# Altium footprint library Components.PcbLib: 63 footprints (part 1 of 4)
Each footprint in its own frame and in the unit in brackets; x right, y up, seen from the top. Pads: shape width x height; smd on the part's side, far side on the other; paste and mask are expansions set on the pad; w line width, h text height; cw(c..) or ccw(c..) is an arc to the next point about the centre after c.
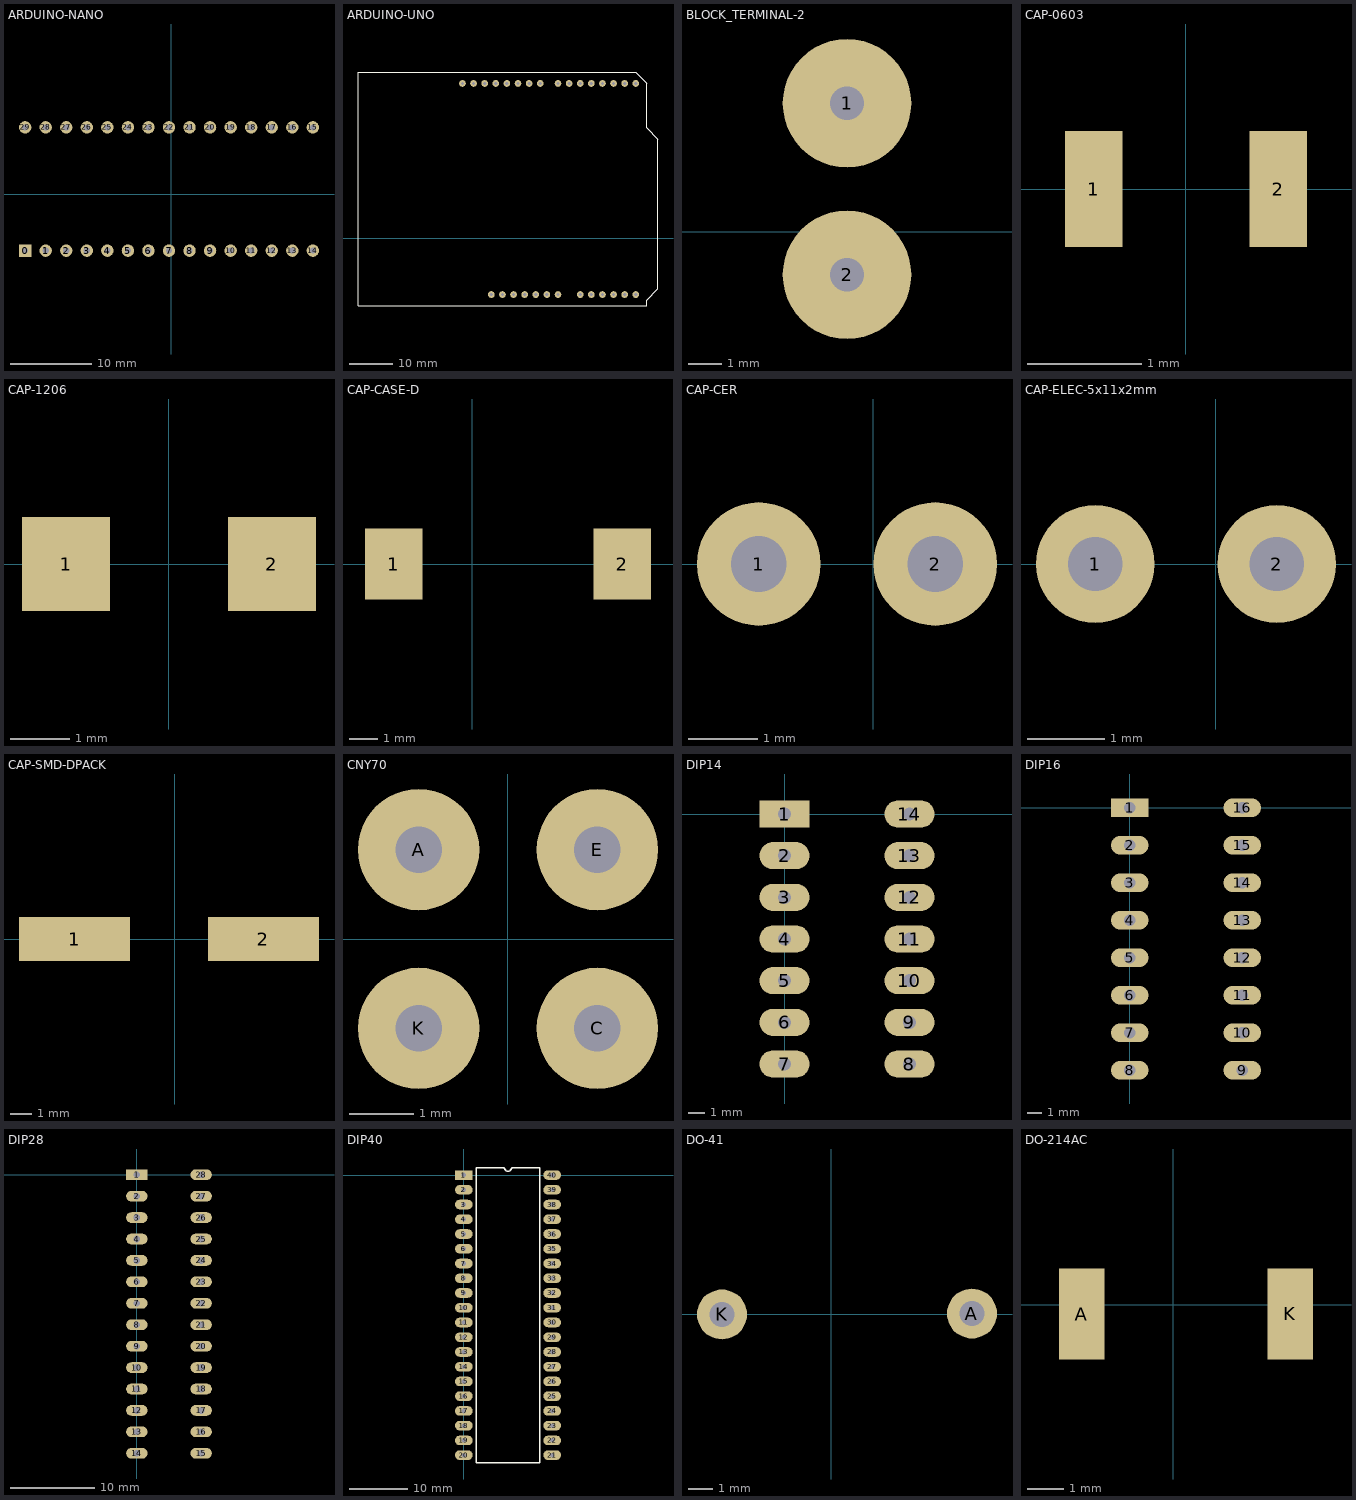
[diagram p0: the footprints below, top view; thin cyan lines are the x and y axes]

## ARDUINO-NANO [mil]
pads (30):
  rect 60x60 hole 30: 0(-711.22,-275.08)
  round 60 hole 30: 1(-611.22,-275.08) 2(-511.22,-275.08) 3(-411.22,-275.08) 4(-311.22,-275.08) 5(-211.22,-275.08) 6(-111.22,-275.08) 7(-11.22,-275.08) 8(88.78,-275.08) 9(188.78,-275.08) 10(288.78,-275.08) 11(388.78,-275.08) 12(488.78,-275.08) 13(588.78,-275.08) 14(688.78,-275.08) 15(688.78,324.92) 16(588.78,324.92) 17(488.78,324.92) 18(388.78,324.92) 19(288.78,324.92) 20(188.78,324.92) 21(88.78,324.92) 22(-11.22,324.92) 23(-111.22,324.92) 24(-211.22,324.92) 25(-311.22,324.92) 26(-411.22,324.92) 27(-511.22,324.92) 28(-611.22,324.92) 29(-711.22,324.92)

## ARDUINO-UNO [mil]
pads (29):
  round 60 hole 30: 0(3562.2,1394.49) 1(3462.2,1394.49) 2(3362.2,1394.49) 3(3262.2,1394.49) 3.3V(2462.2,-505.51) 4(3162.2,1394.49) 5(3062.2,1394.49) 5V(2562.2,-505.51) 6(2962.2,1394.49) 7(2862.2,1394.49) 8(2702.2,1394.49) 9(2602.2,1394.49) 10(2502.2,1394.49) 11(2402.2,1394.49) 12(2302.2,1394.49) 13(2202.2,1394.49) A0(3062.2,-505.51) A1(3162.2,-505.51) A2(3262.2,-505.51) A3(3362.2,-505.51) A4(3462.2,-505.51) A5(3562.2,-505.51) AREF(2002.2,1394.49) GND(2102.2,1394.49) GND(2662.2,-505.51) GND(2762.2,-505.51) IOREF(2262.2,-505.51) RESET(2362.2,-505.51) VIN(2862.2,-505.51)
Top Overlay:
  lines w5: 1062.2,-605.51 3662.2,-605.51 3662.2,-555.51 3762.2,-455.51 3762.2,894.49 3662.2,994.49 3662.2,1394.49 3562.2,1494.49 1062.2,1494.49 1062.2,-605.51

## BLOCK_TERMINAL-2 [mil]
pads (2):
  round 150 hole 39.37: 1(445,150) 2(445,-50)
3D body "User Library-TB2.STEP": height 400, standoff -131.5, extent 265.04,-146.85 580,246.85

## CAP-0603 [mil]
pads (2):
  rect 20x40 smd: 1(-31.89,0) 2(31.89,0)
3D body "User Library-0603 SMD Capacitor.step": height 11.89, standoff 0, extent -31.49,-15.74 31.5,15.75

## CAP-1206 [mm]
pads (2):
  rect 1.5x1.6 smd: 1(-1.75,0) 2(1.75,0)
3D body "User Library-1206 SMD Capacitor.step": height 1.26, standoff 0.25, extent -1.6,-0.762 1.6,0.838

## CAP-CASE-D [mil]
pads (2):
  rect 80x100 smd: 1(-110,0) 2(210,0)
3D body "User Library-Tantalum Cap Case D.step": height 110.24, standoff 0, extent -90.55,-84.64 190.56,84.65

## CAP-CER [mil]
pads (2):
  round 70 hole 31.5: 1(-65,0) 2(35,0)
3D body "User Library-Ceramic Capacitor 5x3_75mm.step": height 206.79, standoff -145.91, extent -106.8,-44.37 86.79,34.37

## CAP-ELEC-5x11x2mm [mil]
pads (2):
  round 60 hole 27.56: 1(-61,0) 2(31,0)
3D body "User Library-Cap electro 5x11x2mm.step": height 453.76, standoff -128.81, extent -114.42,-99.42 84.43,99.43

## CAP-SMD-DPACK [mil]
pads (2):
  rect 200x80 smd: 1(-180,0) 2(160,0)
3D body "User Library-ALU-D.STEP": height 222.6, standoff 10, extent -145.59,-124.92 130,134.92

## CNY70 [mm]
pads (4):
  round 1.9 hole 0.73: A(-1.4,1.4) C(1.4,-1.4) E(1.4,1.4) K(-1.4,-1.4)
3D body "User Library-cny70.step": height 6, standoff -5, extent -3.5,-3.767 3.5,3.2

## DIP14 [mil]
pads (14):
  rect 120x65 hole 31.5: 1(0,0)
  oval 120x65 hole 31.5: 2(0,-100) 3(0,-200) 4(0,-300) 5(0,-400) 6(0,-500) 7(0,-600) 8(300,-600) 9(300,-500) 10(300,-400) 11(300,-300) 12(300,-200) 13(300,-100) 14(300,0)
3D body "CircuitWorks-DIP-14.step": height 159.45, standoff -115.35, extent -7.48,-675 307.48,75

## DIP16 [mm]
pads (16):
  rect 2.54x1.27 hole 0.8: 1(0,0)
  oval 2.54x1.27 hole 0.8: 2(0,-2.54) 3(0,-5.08) 4(0,-7.62) 5(0,-10.16) 6(0,-12.7) 7(0,-15.24) 8(0,-17.78) 9(7.62,-17.78) 10(7.62,-15.24) 11(7.62,-12.7) 12(7.62,-10.16) 13(7.62,-7.62) 14(7.62,-5.08) 15(7.62,-2.54) 16(7.62,0)
3D body "CircuitWorks-DIP 16 IC.step": height 5.1, standoff -3.3, extent -0.125,-18.89 7.745,1.11

## DIP28 [mm]
pads (28):
  rect 2.54x1.27 hole 0.8: 1(0,0)
  oval 2.54x1.27 hole 0.8: 2(0,-2.54) 3(0,-5.08) 4(0,-7.62) 5(0,-10.16) 6(0,-12.7) 7(0,-15.24) 8(0,-17.78) 9(0,-20.32) 10(0,-22.86) 11(0,-25.4) 12(0,-27.94) 13(0,-30.48) 14(0,-33.02) 15(7.62,-33.02) 16(7.62,-30.48) 17(7.62,-27.94) 18(7.62,-25.4) 19(7.62,-22.86) 20(7.62,-20.32) 21(7.62,-17.78) 22(7.62,-15.24) 23(7.62,-12.7) 24(7.62,-10.16) 25(7.62,-7.62) 26(7.62,-5.08) 27(7.62,-2.54) 28(7.62,0)
3D body "User Library-User Library-ATmega 48_88_168_328 28P3_90DEG.step": height 5.09, standoff -2.04, extent -0.254,-33.761 7.652,0.889

## DIP40 [mil]
pads (40):
  rect 120x65 hole 31.5: 1(0,0)
  oval 120x65 hole 31.5: 2(0,-100) 3(0,-200) 4(0,-300) 5(0,-400) 6(0,-500) 7(0,-600) 8(0,-700) 9(0,-800) 10(0,-900) 11(0,-1000) 12(0,-1100) 13(0,-1200) 14(0,-1300) 15(0,-1400) 16(0,-1500) 17(0,-1600) 18(0,-1700) 19(0,-1800) 20(0,-1900) 21(600,-1900) 22(600,-1800) 23(600,-1700) 24(600,-1600) 25(600,-1500) 26(600,-1400) 27(600,-1300) 28(600,-1200) 29(600,-1100) 30(600,-1000) 31(600,-900) 32(600,-800) 33(600,-700) 34(600,-600) 35(600,-500) 36(600,-400) 37(600,-300) 38(600,-200) 39(600,-100) 40(600,0)
Top Overlay:
  lines w10: 85,-1950 85,50 275,50 ccw(c300,50) 325,50 515,50 515,-1950 85,-1950
3D body "User Library-DIP40-600-with-chip-Type2.step": height 317.08, standoff -122.29, extent -48.46,-1979 644.46,78.48

## DO-41 [mil]
pads (2):
  round 80 hole 39.37: A(224.99,1.45) K(-175,0)
3D body "User Library-DO-41-2.step": height 107.09, standoff -102.36, extent -192.01,-52.08 242.01,55

## DO-214AC [mil]
pads (2):
  rect 50x100 smd: A(-100,-10) K(128.01,-9.99)
3D body "User Library-DO-214AC(SMA).step": height 95, standoff 5, extent -87.99,-64.99 128.01,45